# Altium schematic symbol library WR-TBL_Pluggable PCB Header.SchLib: 719 symbols (part 2 of 5) (continued)
## 691314520120
designator P?
WR-TBL Serie 314 Close 45deg PCB Header, Pluggable, pitch 5.08mm, 20p; Part Number: 691314520120; Compliance: RoHS; Modularity: No; Pin Number: 20; Rated Current [UL]: 20A; Working Voltage [UL]: 300VAC; ComponentLink1Description: Manufacturer; ComponentLink1URL: http://www.we-online.de; ComponentLink2URL: https://katalog.we-online.de/em/datasheet/691314520120.pdf; ComponentLink2Description: Datasheet; Mounting Technology: THT; Packaging: Box; Operating Temperature: -40 to +105degC; PCB/Cable/Panel: PCB; Pitch: 5.08mm; Published Date: October 2019; Type: 45deg; Publisher: Wurth Elektronik; Application: Pluggable
footprint 691314520120
pins: 1, 2, 3, 4, 5, 6, 7, 8, 9, 10, 11, 12, 13, 14, 15, 16, 17, 18, 19, 20

## 691314520121
designator P?
WR-TBL Serie 314 Close 45deg PCB Header, Pluggable, pitch 5.08mm, 21p; Part Number: 691314520121; Compliance: RoHS; Modularity: No; Pin Number: 21; Rated Current [UL]: 20A; Working Voltage [UL]: 300VAC; ComponentLink1Description: Manufacturer; ComponentLink1URL: http://www.we-online.de; ComponentLink2URL: https://katalog.we-online.de/em/datasheet/691314520121.pdf; ComponentLink2Description: Datasheet; Mounting Technology: THT; Packaging: Box; Operating Temperature: -40 to +105degC; PCB/Cable/Panel: PCB; Pitch: 5.08mm; Published Date: October 2019; Type: 45deg; Publisher: Wurth Elektronik; Application: Pluggable
footprint 691314520121
pins: 1, 2, 3, 4, 5, 6, 7, 8, 9, 10, 11, 12, 13, 14, 15, 16, 17, 18, 19, 20, 21

## 691314520122
designator P?
WR-TBL Serie 314 Close 45deg PCB Header, Pluggable, pitch 5.08mm, 22p; Part Number: 691314520122; Compliance: RoHS; Modularity: No; Pin Number: 22; Rated Current [UL]: 20A; Working Voltage [UL]: 300VAC; ComponentLink1Description: Manufacturer; ComponentLink1URL: http://www.we-online.de; ComponentLink2URL: https://katalog.we-online.de/em/datasheet/691314520122.pdf; ComponentLink2Description: Datasheet; Mounting Technology: THT; Packaging: Box; Operating Temperature: -40 to +105degC; PCB/Cable/Panel: PCB; Pitch: 5.08mm; Published Date: October 2019; Type: 45deg; Publisher: Wurth Elektronik; Application: Pluggable
footprint 691314520122
pins: 1, 2, 3, 4, 5, 6, 7, 8, 9, 10, 11, 12, 13, 14, 15, 16, 17, 18, 19, 20, 21, 22

## 691314520123
designator P?
WR-TBL Serie 314 Close 45deg PCB Header, Pluggable, pitch 5.08mm, 23p; Part Number: 691314520123; Compliance: RoHS; Modularity: No; Pin Number: 23; Rated Current [UL]: 20A; Working Voltage [UL]: 300VAC; ComponentLink1Description: Manufacturer; ComponentLink1URL: http://www.we-online.de; ComponentLink2URL: https://katalog.we-online.de/em/datasheet/691314520123.pdf; ComponentLink2Description: Datasheet; Mounting Technology: THT; Packaging: Box; Operating Temperature: -40 to +105degC; PCB/Cable/Panel: PCB; Pitch: 5.08mm; Published Date: October 2019; Type: 45deg; Publisher: Wurth Elektronik; Application: Pluggable
footprint 691314520123
pins: 1, 2, 3, 4, 5, 6, 7, 8, 9, 10, 11, 12, 13, 14, 15, 16, 17, 18, 19, 20, 21, 22, 23

## 691314520124
designator P?
WR-TBL Serie 314 Close 45deg PCB Header, Pluggable, pitch 5.08mm, 24p; Part Number: 691314520124; Compliance: RoHS; Modularity: No; Pin Number: 24; Rated Current [UL]: 20A; Working Voltage [UL]: 300VAC; ComponentLink1Description: Manufacturer; ComponentLink1URL: http://www.we-online.de; ComponentLink2URL: https://katalog.we-online.de/em/datasheet/691314520124.pdf; ComponentLink2Description: Datasheet; Mounting Technology: THT; Packaging: Box; Operating Temperature: -40 to +105degC; PCB/Cable/Panel: PCB; Pitch: 5.08mm; Published Date: October 2019; Type: 45deg; Publisher: Wurth Elektronik; Application: Pluggable
footprint 691314520124
pins: 1, 2, 3, 4, 5, 6, 7, 8, 9, 10, 11, 12, 13, 14, 15, 16, 17, 18, 19, 20, 21, 22, 23, 24

## 691317410002
designator P?
WR-TBL Serie 3174 Close Horizontal PCB Header, Pluggable, pitch 7.62mm, 2p; Part Number: 691317410002; Compliance: RoHS; Modularity: No; Pin Number: 2; Rated Current [UL]: 20A; Working Voltage [UL]: 300VAC; ComponentLink1Description: Manufacturer; ComponentLink1URL: http://www.we-online.de; ComponentLink2URL: https://katalog.we-online.de/em/datasheet/691317410002.pdf; ComponentLink2Description: Datasheet; Mounting Technology: THT; Packaging: Box; Operating Temperature: -40 to +105degC; PCB/Cable/Panel: PCB; Pitch: 7.62mm; Published Date: October 2019; Type: Horizontal; Publisher: Wurth Elektronik; Application: Pluggable
footprint 691317410002
pins: 1, 2

## 691317410003
designator P?
WR-TBL Serie 3174 Close Horizontal PCB Header, Pluggable, pitch 7.62mm, 3p; Part Number: 691317410003; Compliance: RoHS; Modularity: No; Pin Number: 3; Rated Current [UL]: 20A; Working Voltage [UL]: 300VAC; ComponentLink1Description: Manufacturer; ComponentLink1URL: http://www.we-online.de; ComponentLink2URL: https://katalog.we-online.de/em/datasheet/691317410003.pdf; ComponentLink2Description: Datasheet; Mounting Technology: THT; Packaging: Box; Operating Temperature: -40 to +105degC; PCB/Cable/Panel: PCB; Pitch: 7.62mm; Published Date: October 2019; Type: Horizontal; Publisher: Wurth Elektronik; Application: Pluggable
footprint 691317410003
pins: 1, 2, 3

## 691317410004
designator P?
WR-TBL Serie 3174 Close Horizontal PCB Header, Pluggable, pitch 7.62mm, 4p; Part Number: 691317410004; Compliance: RoHS; Modularity: No; Pin Number: 4; Rated Current [UL]: 20A; Working Voltage [UL]: 300VAC; ComponentLink1Description: Manufacturer; ComponentLink1URL: http://www.we-online.de; ComponentLink2URL: https://katalog.we-online.de/em/datasheet/691317410004.pdf; ComponentLink2Description: Datasheet; Mounting Technology: THT; Packaging: Box; Operating Temperature: -40 to +105degC; PCB/Cable/Panel: PCB; Pitch: 7.62mm; Published Date: October 2019; Type: Horizontal; Publisher: Wurth Elektronik; Application: Pluggable
footprint 691317410004
pins: 1, 2, 3, 4

## 691317410005
designator P?
WR-TBL Serie 3174 Close Horizontal PCB Header, Pluggable, pitch 7.62mm, 5p; Part Number: 691317410005; Compliance: RoHS; Modularity: No; Pin Number: 5; Rated Current [UL]: 20A; Working Voltage [UL]: 300VAC; ComponentLink1Description: Manufacturer; ComponentLink1URL: http://www.we-online.de; ComponentLink2URL: https://katalog.we-online.de/em/datasheet/691317410005.pdf; ComponentLink2Description: Datasheet; Mounting Technology: THT; Packaging: Box; Operating Temperature: -40 to +105degC; PCB/Cable/Panel: PCB; Pitch: 7.62mm; Published Date: October 2019; Type: Horizontal; Publisher: Wurth Elektronik; Application: Pluggable
footprint 691317410005
pins: 1, 2, 3, 4, 5

## 691317410006
designator P?
WR-TBL Serie 3174 Close Horizontal PCB Header, Pluggable, pitch 7.62mm, 6p; Part Number: 691317410006; Compliance: RoHS; Modularity: No; Pin Number: 6; Rated Current [UL]: 20A; Working Voltage [UL]: 300VAC; ComponentLink1Description: Manufacturer; ComponentLink1URL: http://www.we-online.de; ComponentLink2URL: https://katalog.we-online.de/em/datasheet/691317410006.pdf; ComponentLink2Description: Datasheet; Mounting Technology: THT; Packaging: Box; Operating Temperature: -40 to +105degC; PCB/Cable/Panel: PCB; Pitch: 7.62mm; Published Date: October 2019; Type: Horizontal; Publisher: Wurth Elektronik; Application: Pluggable
footprint 691317410006
pins: 1, 2, 3, 4, 5, 6

## 691317410007
designator P?
WR-TBL Serie 3174 Close Horizontal PCB Header, Pluggable, pitch 7.62mm, 7p; Part Number: 691317410007; Compliance: RoHS; Modularity: No; Pin Number: 7; Rated Current [UL]: 20A; Working Voltage [UL]: 300VAC; ComponentLink1Description: Manufacturer; ComponentLink1URL: http://www.we-online.de; ComponentLink2URL: https://katalog.we-online.de/em/datasheet/691317410007.pdf; ComponentLink2Description: Datasheet; Mounting Technology: THT; Packaging: Box; Operating Temperature: -40 to +105degC; PCB/Cable/Panel: PCB; Pitch: 7.62mm; Published Date: October 2019; Type: Horizontal; Publisher: Wurth Elektronik; Application: Pluggable
footprint 691317410007
pins: 1, 2, 3, 4, 5, 6, 7

## 691317410008
designator P?
WR-TBL Serie 3174 Close Horizontal PCB Header, Pluggable, pitch 7.62mm, 8p; Part Number: 691317410008; Compliance: RoHS; Modularity: No; Pin Number: 8; Rated Current [UL]: 20A; Working Voltage [UL]: 300VAC; ComponentLink1Description: Manufacturer; ComponentLink1URL: http://www.we-online.de; ComponentLink2URL: https://katalog.we-online.de/em/datasheet/691317410008.pdf; ComponentLink2Description: Datasheet; Mounting Technology: THT; Packaging: Box; Operating Temperature: -40 to +105degC; PCB/Cable/Panel: PCB; Pitch: 7.62mm; Published Date: October 2019; Type: Horizontal; Publisher: Wurth Elektronik; Application: Pluggable
footprint 691317410008
pins: 1, 2, 3, 4, 5, 6, 7, 8

## 691317410012
designator P?
WR-TBL Serie 3174 Close Horizontal PCB Header, Pluggable, pitch 7.62mm, 12p; Part Number: 691317410012; Compliance: RoHS; Modularity: No; Pin Number: 12; Rated Current [UL]: 20A; Working Voltage [UL]: 300VAC; ComponentLink1Description: Manufacturer; ComponentLink1URL: http://www.we-online.de; ComponentLink2URL: https://katalog.we-online.de/em/datasheet/691317410012.pdf; ComponentLink2Description: Datasheet; Mounting Technology: THT; Packaging: Box; Operating Temperature: -40 to +105degC; PCB/Cable/Panel: PCB; Pitch: 7.62mm; Published Date: October 2019; Type: Horizontal; Publisher: Wurth Elektronik; Application: Pluggable
footprint 691317410012
pins: 1, 2, 3, 4, 5, 6, 7, 8, 9, 10, 11, 12

## 691317510002
designator P?
WR-TBL Serie 3175 Close Horizontal PCB Header with Flanges, Pluggable, pitch 5.08mm, 2p; Part Number: 691317510002; Compliance: RoHS; Modularity: No; Pin Number: 2; Rated Current [UL]: 20A; Working Voltage [UL]: 300VAC; ComponentLink1Description: Manufacturer; ComponentLink1URL: http://www.we-online.de; ComponentLink2URL: https://katalog.we-online.de/em/datasheet/691317510002.pdf; ComponentLink2Description: Datasheet; Mounting Technology: THT; Packaging: Box; Operating Temperature: -40 to +105degC; PCB/Cable/Panel: PCB; Pitch: 5.08mm; Published Date: October 2019; Type: Horizontal; Publisher: Wurth Elektronik; Application: Pluggable
footprint 691317510002
pins: 1, 2

## 691317510003
designator P?
WR-TBL Serie 3175 Close Horizontal PCB Header with Flanges, Pluggable, pitch 5.08mm, 3p; Part Number: 691317510003; Compliance: RoHS; Modularity: No; Pin Number: 3; Rated Current [UL]: 20A; Working Voltage [UL]: 300VAC; ComponentLink1Description: Manufacturer; ComponentLink1URL: http://www.we-online.de; ComponentLink2URL: https://katalog.we-online.de/em/datasheet/691317510003.pdf; ComponentLink2Description: Datasheet; Mounting Technology: THT; Packaging: Box; Operating Temperature: -40 to +105degC; PCB/Cable/Panel: PCB; Pitch: 5.08mm; Published Date: October 2019; Type: Horizontal; Publisher: Wurth Elektronik; Application: Pluggable
footprint 691317510003
pins: 1, 2, 3

## 691317510004
designator P?
WR-TBL Serie 3175 Close Horizontal PCB Header with Flanges, Pluggable, pitch 5.08mm, 4p; Part Number: 691317510004; Compliance: RoHS; Modularity: No; Pin Number: 4; Rated Current [UL]: 20A; Working Voltage [UL]: 300VAC; ComponentLink1Description: Manufacturer; ComponentLink1URL: http://www.we-online.de; ComponentLink2URL: https://katalog.we-online.de/em/datasheet/691317510004.pdf; ComponentLink2Description: Datasheet; Mounting Technology: THT; Packaging: Box; Operating Temperature: -40 to +105degC; PCB/Cable/Panel: PCB; Pitch: 5.08mm; Published Date: October 2019; Type: Horizontal; Publisher: Wurth Elektronik; Application: Pluggable
footprint 691317510004
pins: 1, 2, 3, 4

## 691317510005
designator P?
WR-TBL Serie 3175 Close Horizontal PCB Header with Flanges, Pluggable, pitch 5.08mm, 5p; Part Number: 691317510005; Compliance: RoHS; Modularity: No; Pin Number: 5; Rated Current [UL]: 20A; Working Voltage [UL]: 300VAC; ComponentLink1Description: Manufacturer; ComponentLink1URL: http://www.we-online.de; ComponentLink2URL: https://katalog.we-online.de/em/datasheet/691317510005.pdf; ComponentLink2Description: Datasheet; Mounting Technology: THT; Packaging: Box; Operating Temperature: -40 to +105degC; PCB/Cable/Panel: PCB; Pitch: 5.08mm; Published Date: October 2019; Type: Horizontal; Publisher: Wurth Elektronik; Application: Pluggable
footprint 691317510005
pins: 1, 2, 3, 4, 5

## 691317510006
designator P?
WR-TBL Serie 3175 Close Horizontal PCB Header with Flanges, Pluggable, pitch 5.08mm, 6p; Part Number: 691317510006; Compliance: RoHS; Modularity: No; Pin Number: 6; Rated Current [UL]: 20A; Working Voltage [UL]: 300VAC; ComponentLink1Description: Manufacturer; ComponentLink1URL: http://www.we-online.de; ComponentLink2URL: https://katalog.we-online.de/em/datasheet/691317510006.pdf; ComponentLink2Description: Datasheet; Mounting Technology: THT; Packaging: Box; Operating Temperature: -40 to +105degC; PCB/Cable/Panel: PCB; Pitch: 5.08mm; Published Date: October 2019; Type: Horizontal; Publisher: Wurth Elektronik; Application: Pluggable
footprint 691317510006
pins: 1, 2, 3, 4, 5, 6

## 691317510007
designator P?
WR-TBL Serie 3175 Close Horizontal PCB Header with Flanges, Pluggable, pitch 5.08mm, 7p; Part Number: 691317510007; Compliance: RoHS; Modularity: No; Pin Number: 7; Rated Current [UL]: 20A; Working Voltage [UL]: 300VAC; ComponentLink1Description: Manufacturer; ComponentLink1URL: http://www.we-online.de; ComponentLink2URL: https://katalog.we-online.de/em/datasheet/691317510007.pdf; ComponentLink2Description: Datasheet; Mounting Technology: THT; Packaging: Box; Operating Temperature: -40 to +105degC; PCB/Cable/Panel: PCB; Pitch: 5.08mm; Published Date: October 2019; Type: Horizontal; Publisher: Wurth Elektronik; Application: Pluggable
footprint 691317510007
pins: 1, 2, 3, 4, 5, 6, 7

## 691317510008
designator P?
WR-TBL Serie 3175 Close Horizontal PCB Header with Flanges, Pluggable, pitch 5.08mm, 8p; Part Number: 691317510008; Compliance: RoHS; Modularity: No; Pin Number: 8; Rated Current [UL]: 20A; Working Voltage [UL]: 300VAC; ComponentLink1Description: Manufacturer; ComponentLink1URL: http://www.we-online.de; ComponentLink2URL: https://katalog.we-online.de/em/datasheet/691317510008.pdf; ComponentLink2Description: Datasheet; Mounting Technology: THT; Packaging: Box; Operating Temperature: -40 to +105degC; PCB/Cable/Panel: PCB; Pitch: 5.08mm; Published Date: October 2019; Type: Horizontal; Publisher: Wurth Elektronik; Application: Pluggable
footprint 691317510008
pins: 1, 2, 3, 4, 5, 6, 7, 8

## 691317510012
designator P?
WR-TBL Serie 3175 Close Horizontal PCB Header with Flanges, Pluggable, pitch 5.08mm, 12p; Part Number: 691317510012; Compliance: RoHS; Modularity: No; Pin Number: 12; Rated Current [UL]: 20A; Working Voltage [UL]: 300VAC; ComponentLink1Description: Manufacturer; ComponentLink1URL: http://www.we-online.de; ComponentLink2URL: https://katalog.we-online.de/em/datasheet/691317510012.pdf; ComponentLink2Description: Datasheet; Mounting Technology: THT; Packaging: Box; Operating Temperature: -40 to +105degC; PCB/Cable/Panel: PCB; Pitch: 5.08mm; Published Date: October 2019; Type: Horizontal; Publisher: Wurth Elektronik; Application: Pluggable
footprint 691317510012
pins: 1, 2, 3, 4, 5, 6, 7, 8, 9, 10, 11, 12

## 691317710002
designator P?
WR-TBL Serie 3177 Close Horizontal PCB Header with Flanges, Pluggable, pitch 5mm, 2p; Part Number: 691317710002; Compliance: RoHS; Modularity: No; Pin Number: 2; Rated Current [UL]: 20A; Working Voltage [UL]: 300VAC; ComponentLink1Description: Manufacturer; ComponentLink1URL: http://www.we-online.de; ComponentLink2URL: https://katalog.we-online.de/em/datasheet/691317710002.pdf; ComponentLink2Description: Datasheet; Mounting Technology: THT; Packaging: Box; Operating Temperature: -40 to +105degC; PCB/Cable/Panel: PCB; Pitch: 5mm; Published Date: October 2019; Type: Horizontal; Publisher: Wurth Elektronik; Application: Pluggable
footprint 691317710002
pins: 1, 2

## 691317710003
designator P?
WR-TBL Serie 3177 Close Horizontal PCB Header with Flanges, Pluggable, pitch 5mm, 3p; Part Number: 691317710003; Compliance: RoHS; Modularity: No; Pin Number: 3; Rated Current [UL]: 20A; Working Voltage [UL]: 300VAC; ComponentLink1Description: Manufacturer; ComponentLink1URL: http://www.we-online.de; ComponentLink2URL: https://katalog.we-online.de/em/datasheet/691317710003.pdf; ComponentLink2Description: Datasheet; Mounting Technology: THT; Packaging: Box; Operating Temperature: -40 to +105degC; PCB/Cable/Panel: PCB; Pitch: 5mm; Published Date: October 2019; Type: Horizontal; Publisher: Wurth Elektronik; Application: Pluggable
footprint 691317710003
pins: 1, 2, 3

## 691317710004
designator P?
WR-TBL Serie 3177 Close Horizontal PCB Header with Flanges, Pluggable, pitch 5mm, 4p; Part Number: 691317710004; Compliance: RoHS; Modularity: No; Pin Number: 4; Rated Current [UL]: 20A; Working Voltage [UL]: 300VAC; ComponentLink1Description: Manufacturer; ComponentLink1URL: http://www.we-online.de; ComponentLink2URL: https://katalog.we-online.de/em/datasheet/691317710004.pdf; ComponentLink2Description: Datasheet; Mounting Technology: THT; Packaging: Box; Operating Temperature: -40 to +105degC; PCB/Cable/Panel: PCB; Pitch: 5mm; Published Date: October 2019; Type: Horizontal; Publisher: Wurth Elektronik; Application: Pluggable
footprint 691317710004
pins: 1, 2, 3, 4

## 691317710005
designator P?
WR-TBL Serie 3177 Close Horizontal PCB Header with Flanges, Pluggable, pitch 5mm, 5p; Part Number: 691317710005; Compliance: RoHS; Modularity: No; Pin Number: 5; Rated Current [UL]: 20A; Working Voltage [UL]: 300VAC; ComponentLink1Description: Manufacturer; ComponentLink1URL: http://www.we-online.de; ComponentLink2URL: https://katalog.we-online.de/em/datasheet/691317710005.pdf; ComponentLink2Description: Datasheet; Mounting Technology: THT; Packaging: Box; Operating Temperature: -40 to +105degC; PCB/Cable/Panel: PCB; Pitch: 5mm; Published Date: October 2019; Type: Horizontal; Publisher: Wurth Elektronik; Application: Pluggable
footprint 691317710005
pins: 1, 2, 3, 4, 5

## 691317710006
designator P?
WR-TBL Serie 3177 Close Horizontal PCB Header with Flanges, Pluggable, pitch 5mm, 6p; Part Number: 691317710006; Compliance: RoHS; Modularity: No; Pin Number: 6; Rated Current [UL]: 20A; Working Voltage [UL]: 300VAC; ComponentLink1Description: Manufacturer; ComponentLink1URL: http://www.we-online.de; ComponentLink2URL: https://katalog.we-online.de/em/datasheet/691317710006.pdf; ComponentLink2Description: Datasheet; Mounting Technology: THT; Packaging: Box; Operating Temperature: -40 to +105degC; PCB/Cable/Panel: PCB; Pitch: 5mm; Published Date: October 2019; Type: Horizontal; Publisher: Wurth Elektronik; Application: Pluggable
footprint 691317710006
pins: 1, 2, 3, 4, 5, 6

## 691317710007
designator P?
WR-TBL Serie 3177 Close Horizontal PCB Header with Flanges, Pluggable, pitch 5mm, 7p; Part Number: 691317710007; Compliance: RoHS; Modularity: No; Pin Number: 7; Rated Current [UL]: 20A; Working Voltage [UL]: 300VAC; ComponentLink1Description: Manufacturer; ComponentLink1URL: http://www.we-online.de; ComponentLink2URL: https://katalog.we-online.de/em/datasheet/691317710007.pdf; ComponentLink2Description: Datasheet; Mounting Technology: THT; Packaging: Box; Operating Temperature: -40 to +105degC; PCB/Cable/Panel: PCB; Pitch: 5mm; Published Date: October 2019; Type: Horizontal; Publisher: Wurth Elektronik; Application: Pluggable
footprint 691317710007
pins: 1, 2, 3, 4, 5, 6, 7

## 691317710008
designator P?
WR-TBL Serie 3177 Close Horizontal PCB Header with Flanges, Pluggable, pitch 5mm, 8p; Part Number: 691317710008; Compliance: RoHS; Modularity: No; Pin Number: 8; Rated Current [UL]: 20A; Working Voltage [UL]: 300VAC; ComponentLink1Description: Manufacturer; ComponentLink1URL: http://www.we-online.de; ComponentLink2URL: https://katalog.we-online.de/em/datasheet/691317710008.pdf; ComponentLink2Description: Datasheet; Mounting Technology: THT; Packaging: Box; Operating Temperature: -40 to +105degC; PCB/Cable/Panel: PCB; Pitch: 5mm; Published Date: October 2019; Type: Horizontal; Publisher: Wurth Elektronik; Application: Pluggable
footprint 691317710008
pins: 1, 2, 3, 4, 5, 6, 7, 8

## 691317710012
designator P?
WR-TBL Serie 3177 Close Horizontal PCB Header with Flanges, Pluggable, pitch 5mm, 12p; Part Number: 691317710012; Compliance: RoHS; Modularity: No; Pin Number: 12; Rated Current [UL]: 20A; Working Voltage [UL]: 300VAC; ComponentLink1Description: Manufacturer; ComponentLink1URL: http://www.we-online.de; ComponentLink2URL: https://katalog.we-online.de/em/datasheet/691317710012.pdf; ComponentLink2Description: Datasheet; Mounting Technology: THT; Packaging: Box; Operating Temperature: -40 to +105degC; PCB/Cable/Panel: PCB; Pitch: 5mm; Published Date: October 2019; Type: Horizontal; Publisher: Wurth Elektronik; Application: Pluggable
footprint 691317710012
pins: 1, 2, 3, 4, 5, 6, 7, 8, 9, 10, 11, 12

## 691318400002
designator P?
WR-TBL Serie 3184 Close Vertical PCB Header with Flanges, Pluggable, pitch 7.62mm, 2p; Part Number: 691318400002; Compliance: RoHS; Modularity: No; Pin Number: 2; Rated Current [UL]: 20A; Working Voltage [UL]: 300VAC; ComponentLink1Description: Manufacturer; ComponentLink1URL: http://www.we-online.de; ComponentLink2URL: https://katalog.we-online.de/em/datasheet/691318400002.pdf; ComponentLink2Description: Datasheet; Mounting Technology: THT; Packaging: Box; Operating Temperature: -40 to +105degC; PCB/Cable/Panel: PCB; Pitch: 7.62mm; Published Date: October 2019; Type: Vertical; Publisher: Wurth Elektronik; Application: Pluggable
footprint 691318400002
pins: 1, 2

## 691318400003
designator P?
WR-TBL Serie 3184 Close Vertical PCB Header with Flanges, Pluggable, pitch 7.62mm, 3p; Part Number: 691318400003; Compliance: RoHS; Modularity: No; Pin Number: 3; Rated Current [UL]: 20A; Working Voltage [UL]: 300VAC; ComponentLink1Description: Manufacturer; ComponentLink1URL: http://www.we-online.de; ComponentLink2URL: https://katalog.we-online.de/em/datasheet/691318400003.pdf; ComponentLink2Description: Datasheet; Mounting Technology: THT; Packaging: Box; Operating Temperature: -40 to +105degC; PCB/Cable/Panel: PCB; Pitch: 7.62mm; Published Date: October 2019; Type: Vertical; Publisher: Wurth Elektronik; Application: Pluggable
footprint 691318400003
pins: 1, 2, 3

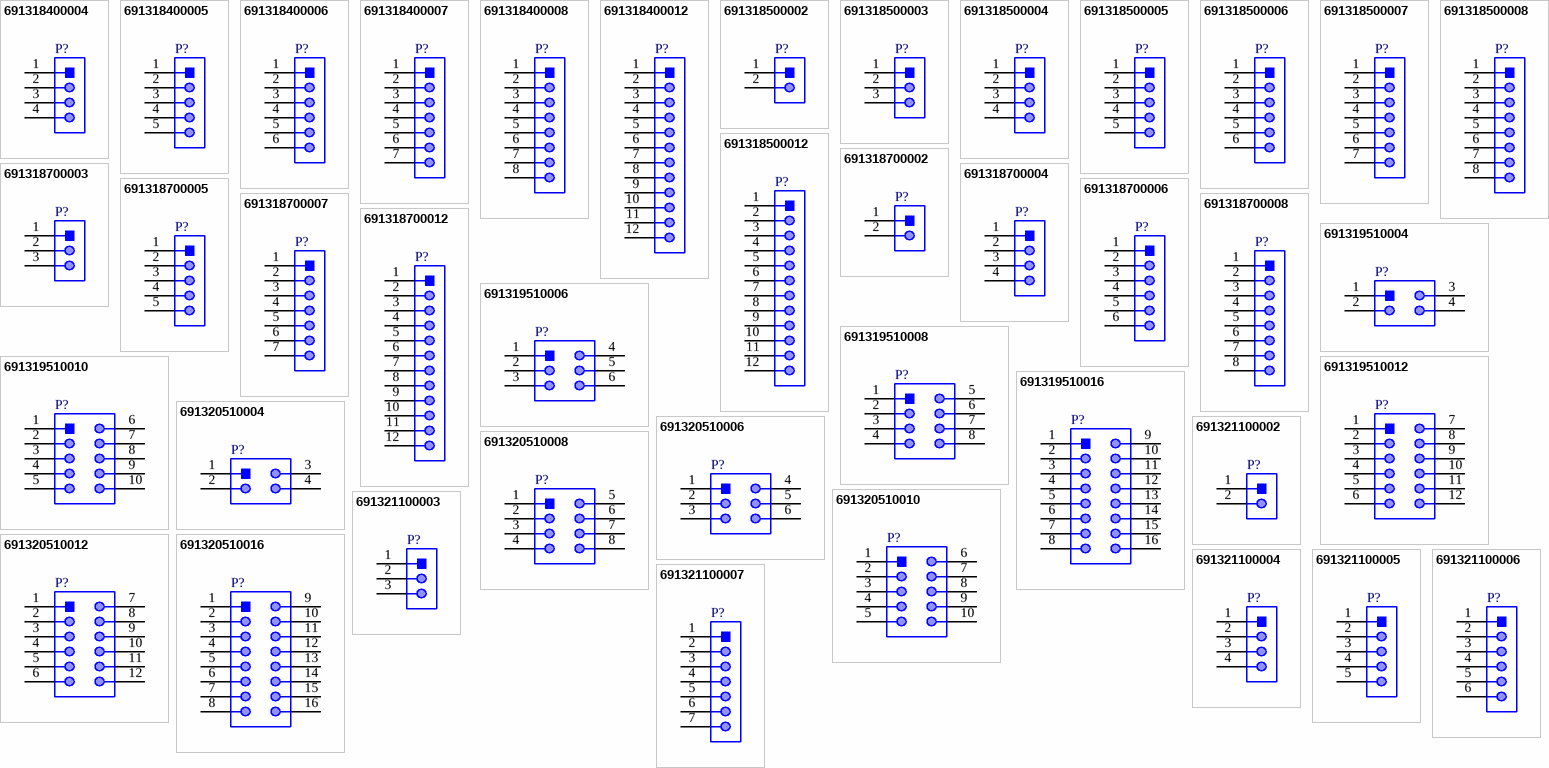
[diagram p8: symbols 691318400004 to 691321100007]

## 691318400004
designator P?
WR-TBL Serie 3184 Close Vertical PCB Header with Flanges, Pluggable, pitch 7.62mm, 4p; Part Number: 691318400004; Compliance: RoHS; Modularity: No; Pin Number: 4; Rated Current [UL]: 20A; Working Voltage [UL]: 300VAC; ComponentLink1Description: Manufacturer; ComponentLink1URL: http://www.we-online.de; ComponentLink2URL: https://katalog.we-online.de/em/datasheet/691318400004.pdf; ComponentLink2Description: Datasheet; Mounting Technology: THT; Packaging: Box; Operating Temperature: -40 to +105degC; PCB/Cable/Panel: PCB; Pitch: 7.62mm; Published Date: October 2019; Type: Vertical; Publisher: Wurth Elektronik; Application: Pluggable
footprint 691318400004
pins: 1, 2, 3, 4

## 691318400005
designator P?
WR-TBL Serie 3184 Close Vertical PCB Header with Flanges, Pluggable, pitch 7.62mm, 5p; Part Number: 691318400005; Compliance: RoHS; Modularity: No; Pin Number: 5; Rated Current [UL]: 20A; Working Voltage [UL]: 300VAC; ComponentLink1Description: Manufacturer; ComponentLink1URL: http://www.we-online.de; ComponentLink2URL: https://katalog.we-online.de/em/datasheet/691318400005.pdf; ComponentLink2Description: Datasheet; Mounting Technology: THT; Packaging: Box; Operating Temperature: -40 to +105degC; PCB/Cable/Panel: PCB; Pitch: 7.62mm; Published Date: October 2019; Type: Vertical; Publisher: Wurth Elektronik; Application: Pluggable
footprint 691318400005
pins: 1, 2, 3, 4, 5

## 691318400006
designator P?
WR-TBL Serie 3184 Close Vertical PCB Header with Flanges, Pluggable, pitch 7.62mm, 6p; Part Number: 691318400006; Compliance: RoHS; Modularity: No; Pin Number: 6; Rated Current [UL]: 20A; Working Voltage [UL]: 300VAC; ComponentLink1Description: Manufacturer; ComponentLink1URL: http://www.we-online.de; ComponentLink2URL: https://katalog.we-online.de/em/datasheet/691318400006.pdf; ComponentLink2Description: Datasheet; Mounting Technology: THT; Packaging: Box; Operating Temperature: -40 to +105degC; PCB/Cable/Panel: PCB; Pitch: 7.62mm; Published Date: October 2019; Type: Vertical; Publisher: Wurth Elektronik; Application: Pluggable
footprint 691318400006
pins: 1, 2, 3, 4, 5, 6

## 691318400007
designator P?
WR-TBL Serie 3184 Close Vertical PCB Header with Flanges, Pluggable, pitch 7.62mm, 7p; Part Number: 691318400007; Compliance: RoHS; Modularity: No; Pin Number: 7; Rated Current [UL]: 20A; Working Voltage [UL]: 300VAC; ComponentLink1Description: Manufacturer; ComponentLink1URL: http://www.we-online.de; ComponentLink2URL: https://katalog.we-online.de/em/datasheet/691318400007.pdf; ComponentLink2Description: Datasheet; Mounting Technology: THT; Packaging: Box; Operating Temperature: -40 to +105degC; PCB/Cable/Panel: PCB; Pitch: 7.62mm; Published Date: October 2019; Type: Vertical; Publisher: Wurth Elektronik; Application: Pluggable
footprint 691318400007
pins: 1, 2, 3, 4, 5, 6, 7

## 691318400008
designator P?
WR-TBL Serie 3184 Close Vertical PCB Header with Flanges, Pluggable, pitch 7.62mm, 8p; Part Number: 691318400008; Compliance: RoHS; Modularity: No; Pin Number: 8; Rated Current [UL]: 20A; Working Voltage [UL]: 300VAC; ComponentLink1Description: Manufacturer; ComponentLink1URL: http://www.we-online.de; ComponentLink2URL: https://katalog.we-online.de/em/datasheet/691318400008.pdf; ComponentLink2Description: Datasheet; Mounting Technology: THT; Packaging: Box; Operating Temperature: -40 to +105degC; PCB/Cable/Panel: PCB; Pitch: 7.62mm; Published Date: October 2019; Type: Vertical; Publisher: Wurth Elektronik; Application: Pluggable
footprint 691318400008
pins: 1, 2, 3, 4, 5, 6, 7, 8

## 691318400012
designator P?
WR-TBL Serie 3184 Close Vertical PCB Header with Flanges, Pluggable, pitch 7.62mm, 12p; Part Number: 691318400012; Compliance: RoHS; Modularity: No; Pin Number: 12; Rated Current [UL]: 20A; Working Voltage [UL]: 300VAC; ComponentLink1Description: Manufacturer; ComponentLink1URL: http://www.we-online.de; ComponentLink2URL: https://katalog.we-online.de/em/datasheet/691318400012.pdf; ComponentLink2Description: Datasheet; Mounting Technology: THT; Packaging: Box; Operating Temperature: -40 to +105degC; PCB/Cable/Panel: PCB; Pitch: 7.62mm; Published Date: October 2019; Type: Vertical; Publisher: Wurth Elektronik; Application: Pluggable
footprint 691318400012
pins: 1, 2, 3, 4, 5, 6, 7, 8, 9, 10, 11, 12

## 691318500002
designator P?
WR-TBL Serie 3185 Close Vertical PCB Header with Flanges, Pluggable, pitch 5.08mm, 2p; Part Number: 691318500002; Compliance: RoHS; Modularity: No; Pin Number: 2; Rated Current [UL]: 20A; Working Voltage [UL]: 300VAC; ComponentLink1Description: Manufacturer; ComponentLink1URL: http://www.we-online.de; ComponentLink2URL: https://katalog.we-online.de/em/datasheet/691318500002.pdf; ComponentLink2Description: Datasheet; Mounting Technology: THT; Packaging: Box; Operating Temperature: -40 to +105degC; PCB/Cable/Panel: PCB; Pitch: 5.08mm; Published Date: October 2019; Type: Vertical; Publisher: Wurth Elektronik; Application: Pluggable
footprint 691318500002
pins: 1, 2

## 691318500003
designator P?
WR-TBL Serie 3185 Close Vertical PCB Header with Flanges, Pluggable, pitch 5.08mm, 3p; Part Number: 691318500003; Compliance: RoHS; Modularity: No; Pin Number: 3; Rated Current [UL]: 20A; Working Voltage [UL]: 300VAC; ComponentLink1Description: Manufacturer; ComponentLink1URL: http://www.we-online.de; ComponentLink2URL: https://katalog.we-online.de/em/datasheet/691318500003.pdf; ComponentLink2Description: Datasheet; Mounting Technology: THT; Packaging: Box; Operating Temperature: -40 to +105degC; PCB/Cable/Panel: PCB; Pitch: 5.08mm; Published Date: October 2019; Type: Vertical; Publisher: Wurth Elektronik; Application: Pluggable
footprint 691318500003
pins: 1, 2, 3

## 691318500004
designator P?
WR-TBL Serie 3185 Close Vertical PCB Header with Flanges, Pluggable, pitch 5.08mm, 4p; Part Number: 691318500004; Compliance: RoHS; Modularity: No; Pin Number: 4; Rated Current [UL]: 20A; Working Voltage [UL]: 300VAC; ComponentLink1Description: Manufacturer; ComponentLink1URL: http://www.we-online.de; ComponentLink2URL: https://katalog.we-online.de/em/datasheet/691318500004.pdf; ComponentLink2Description: Datasheet; Mounting Technology: THT; Packaging: Box; Operating Temperature: -40 to +105degC; PCB/Cable/Panel: PCB; Pitch: 5.08mm; Published Date: October 2019; Type: Vertical; Publisher: Wurth Elektronik; Application: Pluggable
footprint 691318500004
pins: 1, 2, 3, 4

## 691318500005
designator P?
WR-TBL Serie 3185 Close Vertical PCB Header with Flanges, Pluggable, pitch 5.08mm, 5p; Part Number: 691318500005; Compliance: RoHS; Modularity: No; Pin Number: 5; Rated Current [UL]: 20A; Working Voltage [UL]: 300VAC; ComponentLink1Description: Manufacturer; ComponentLink1URL: http://www.we-online.de; ComponentLink2URL: https://katalog.we-online.de/em/datasheet/691318500005.pdf; ComponentLink2Description: Datasheet; Mounting Technology: THT; Packaging: Box; Operating Temperature: -40 to +105degC; PCB/Cable/Panel: PCB; Pitch: 5.08mm; Published Date: October 2019; Type: Vertical; Publisher: Wurth Elektronik; Application: Pluggable
footprint 691318500005
pins: 1, 2, 3, 4, 5

## 691318500006
designator P?
WR-TBL Serie 3185 Close Vertical PCB Header with Flanges, Pluggable, pitch 5.08mm, 6p; Part Number: 691318500006; Compliance: RoHS; Modularity: No; Pin Number: 6; Rated Current [UL]: 20A; Working Voltage [UL]: 300VAC; ComponentLink1Description: Manufacturer; ComponentLink1URL: http://www.we-online.de; ComponentLink2URL: https://katalog.we-online.de/em/datasheet/691318500006.pdf; ComponentLink2Description: Datasheet; Mounting Technology: THT; Packaging: Box; Operating Temperature: -40 to +105degC; PCB/Cable/Panel: PCB; Pitch: 5.08mm; Published Date: October 2019; Type: Vertical; Publisher: Wurth Elektronik; Application: Pluggable
footprint 691318500006
pins: 1, 2, 3, 4, 5, 6

## 691318500007
designator P?
WR-TBL Serie 3185 Close Vertical PCB Header with Flanges, Pluggable, pitch 5.08mm, 7p; Part Number: 691318500007; Compliance: RoHS; Modularity: No; Pin Number: 7; Rated Current [UL]: 20A; Working Voltage [UL]: 300VAC; ComponentLink1Description: Manufacturer; ComponentLink1URL: http://www.we-online.de; ComponentLink2URL: https://katalog.we-online.de/em/datasheet/691318500007.pdf; ComponentLink2Description: Datasheet; Mounting Technology: THT; Packaging: Box; Operating Temperature: -40 to +105degC; PCB/Cable/Panel: PCB; Pitch: 5.08mm; Published Date: October 2019; Type: Vertical; Publisher: Wurth Elektronik; Application: Pluggable
footprint 691318500007
pins: 1, 2, 3, 4, 5, 6, 7

## 691318500008
designator P?
WR-TBL Serie 3185 Close Vertical PCB Header with Flanges, Pluggable, pitch 5.08mm, 8p; Part Number: 691318500008; Compliance: RoHS; Modularity: No; Pin Number: 8; Rated Current [UL]: 20A; Working Voltage [UL]: 300VAC; ComponentLink1Description: Manufacturer; ComponentLink1URL: http://www.we-online.de; ComponentLink2URL: https://katalog.we-online.de/em/datasheet/691318500008.pdf; ComponentLink2Description: Datasheet; Mounting Technology: THT; Packaging: Box; Operating Temperature: -40 to +105degC; PCB/Cable/Panel: PCB; Pitch: 5.08mm; Published Date: October 2019; Type: Vertical; Publisher: Wurth Elektronik; Application: Pluggable
footprint 691318500008
pins: 1, 2, 3, 4, 5, 6, 7, 8

## 691318500012
designator P?
WR-TBL Serie 3185 Close Vertical PCB Header with Flanges, Pluggable, pitch 5.08mm, 12p; Part Number: 691318500012; Compliance: RoHS; Modularity: No; Pin Number: 12; Rated Current [UL]: 20A; Working Voltage [UL]: 300VAC; ComponentLink1Description: Manufacturer; ComponentLink1URL: http://www.we-online.de; ComponentLink2URL: https://katalog.we-online.de/em/datasheet/691318500012.pdf; ComponentLink2Description: Datasheet; Mounting Technology: THT; Packaging: Box; Operating Temperature: -40 to +105degC; PCB/Cable/Panel: PCB; Pitch: 5.08mm; Published Date: October 2019; Type: Vertical; Publisher: Wurth Elektronik; Application: Pluggable
footprint 691318500012
pins: 1, 2, 3, 4, 5, 6, 7, 8, 9, 10, 11, 12

## 691318700002
designator P?
WR-TBL Serie 3187 Close Vertical PCB Header with Flanges, Pluggable, pitch 5mm, 2p; Part Number: 691318700002; Compliance: RoHS; Modularity: No; Pin Number: 2; Rated Current [UL]: 20A; Working Voltage [UL]: 300VAC; ComponentLink1Description: Manufacturer; ComponentLink1URL: http://www.we-online.de; ComponentLink2URL: https://katalog.we-online.de/em/datasheet/691318700002.pdf; ComponentLink2Description: Datasheet; Mounting Technology: THT; Packaging: Box; Operating Temperature: -40 to +105degC; PCB/Cable/Panel: PCB; Pitch: 5mm; Published Date: October 2019; Type: Vertical; Publisher: Wurth Elektronik; Application: Pluggable
footprint 691318700002
pins: 1, 2